# Altium footprint library Conectores GAM.PcbLib: 182 footprints (part 12 of 12)
Each footprint in its own frame and in the unit in brackets; x right, y up, seen from the top. Pads: shape width x height; smd on the part's side, far side on the other; paste and mask are expansions set on the pad; w line width, h text height; cw(c..) or ccw(c..) is an arc to the next point about the centre after c.
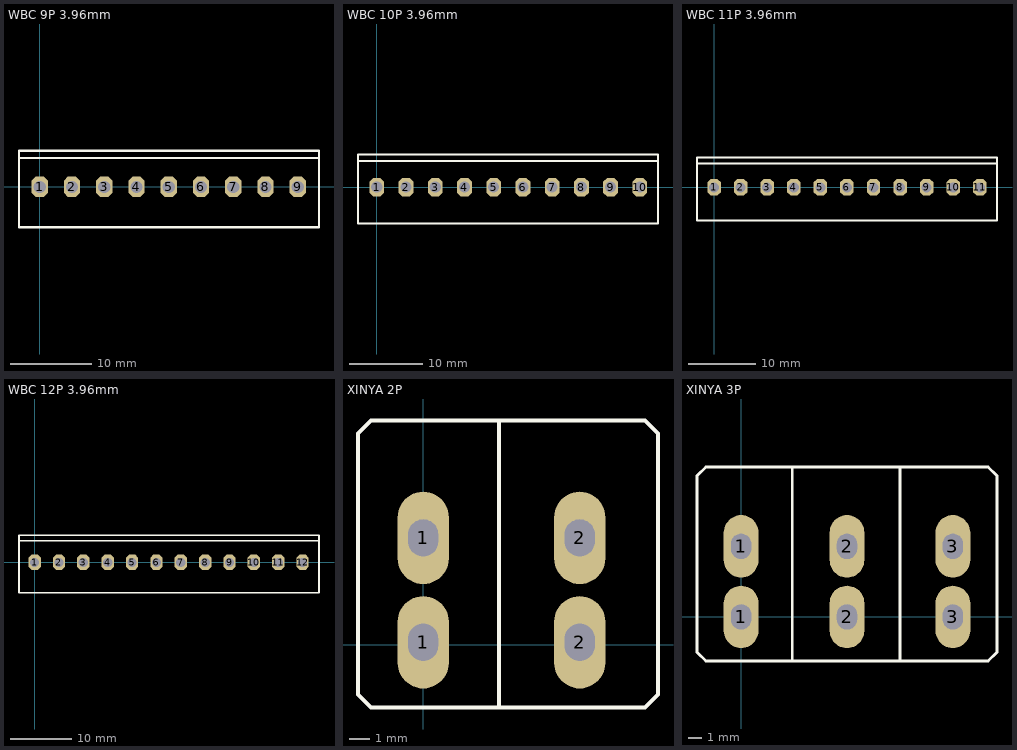
[diagram p11: the footprints below, top view; thin cyan lines are the x and y axes]

## WBC 9P 3.96mm [mm] "Wire to Board Connector 3.96mm 9P"
pads (9):
  oct 2x2.5 hole 1.5: 1(0,0) 2(3.96,0) 3(7.92,0) 4(11.88,0) 5(15.84,0) 6(19.8,0) 7(23.76,0) 8(27.72,0) 9(31.68,0)
Top Overlay:
  lines w0.254: -2.413,3.556 34.29,3.556 ; -2.54,-4.953 -2.54,4.445 34.29,4.445 34.29,-4.953 -2.54,-4.953
3D body "JST - VH - Thru (V) - 9Pin - 3.96mm.stp": height 10.56, standoff -3.76, extent -2.262,-4.648 34.013,4.039

## WBC 10P 3.96mm [mm] "Wire to Board Connector 3.96mm 10P"
pads (10):
  oct 2x2.5 hole 1.5: 1(0,0) 2(3.96,0) 3(7.92,0) 4(11.88,0) 5(15.84,0) 6(19.8,0) 7(23.76,0) 8(27.72,0) 9(31.68,0) 10(35.64,0)
Top Overlay:
  lines w0.254: -2.413,3.556 38.1,3.556 ; -2.54,-4.953 -2.54,4.445 38.1,4.445 38.1,-4.953 -2.54,-4.953
3D body "JST - VH - Thru (V) - 10Pin - 3.96mm.stp": height 10.56, standoff -3.76, extent -2.337,-4.648 37.898,4.039

## WBC 11P 3.96mm [mm] "Wire to Board Connector 3.96mm 11P"
pads (11):
  oct 2x2.5 hole 1.5: 1(0,0) 2(3.96,0) 3(7.92,0) 4(11.88,0) 5(15.84,0) 6(19.8,0) 7(23.76,0) 8(27.72,0) 9(31.68,0) 10(35.64,0) 11(39.6,0)
Top Overlay:
  lines w0.254: -2.413,3.556 42.164,3.556 ; -2.54,-4.953 -2.54,4.445 42.164,4.445 42.164,-4.953 -2.54,-4.953
3D body "JST - VH - Thru (V) - 11Pin - 3.96mm.stp": height 10.56, standoff -3.76, extent -2.285,-4.648 41.91,4.039

## WBC 12P 3.96mm [mm] "Wire to Board Connector 3.96mm 12P"
pads (12):
  oct 2x2.5 hole 1.5: 1(0,0) 2(3.96,0) 3(7.92,0) 4(11.88,0) 5(15.84,0) 6(19.8,0) 7(23.76,0) 8(27.72,0) 9(31.68,0) 10(35.64,0) 11(39.6,0) 12(43.56,0)
Top Overlay:
  lines w0.254: -2.413,3.556 46.228,3.556 ; -2.54,-4.953 -2.54,4.445 46.228,4.445 46.228,-4.953 -2.54,-4.953
3D body "JST - VH - Thru (V) - 12Pin - 3.96mm.stp": height 10.56, standoff -3.76, extent -2.233,-4.648 45.922,4.039

## XINYA 2P [mm] "Faston Connector 2P 7.62mm"
pads (4):
  oval 2.5x4.5 hole 1.45 slot 1.8 at 90 deg: 1(0,0.127) 1(0,5.207) 2(7.62,0.127) 2(7.62,5.207)
Top Overlay:
  lines w0.2: 3.683,-3.048 3.683,10.922 ; -3.175,-2.413 -2.54,-3.048 10.795,-3.048 11.43,-2.413 11.43,10.287 10.795,10.922 -2.54,10.922 -3.175,10.287 -3.175,-2.413
3D body: height 12, standoff 8, extent -3.238,2.159 11.302,7.239
3D body: height 12, standoff 0.5, extent -3.175,7.207 11.303,10.827
3D body "Terminal-1266.step": height 11.36, standoff -1.34, extent -0.405,-0.635 0.405,19.425
3D body "Terminal-1266.step": height 11.36, standoff -1.34, extent 7.215,-0.635 8.025,19.425

## XINYA 3P [mm] "7.62MM TERMINAL FASTON"
pads (6):
  oval 2.5x4.5 hole 1.45 slot 1.8 at 90 deg: 1(0,0) 1(0,5.08) 2(7.62,0) 2(7.62,5.08) 3(15.24,0) 3(15.24,5.08)
Top Overlay:
  lines w0.2: 3.683,-3.175 3.683,10.795 ; 11.43,-3.175 11.43,10.795 ; -3.175,-2.54 -2.54,-3.175 17.78,-3.175 18.415,-2.54 18.415,10.16 17.78,10.795 -2.54,10.795 -3.175,10.16 -3.175,-2.54
3D body: height 12, standoff 8, extent -3.238,2.032 18.288,7.112
3D body: height 12, standoff 0.5, extent -3.175,7.08 18.256,10.7
3D body "Terminal-1266.step": height 11.36, standoff -1.34, extent -0.405,-0.762 0.405,19.298
3D body "Terminal-1266.step": height 11.36, standoff -1.34, extent 7.215,-0.762 8.025,19.298
3D body "Terminal-1266.step": height 11.36, standoff -1.34, extent 14.835,-0.762 15.645,19.298